# Altium schematic symbol library jlcpcb_2025_04_capacitors_extended_0402.schlib: 3594 symbols (part 17 of 20) (continued)
## GRT1555C1H221JA02D
designator C?  Capacitance: 220pF  (hidden comment: *)
Capacitor, Ceramic (MLCC), 220pF, ±5%, 50V, ±5%, SMD 0402; Manufacturer: Murata Electronics; Manufacturer Part Number: GRT1555C1H221JA02D; Package Size: 0402; JLCPCB Basic Part: No; JLCPCB Part Number: C782160; Supplier 1: LCSC; Category: Capacitors - MLCC; Supplier Part Number 1: C782160; Tolerance: ±5%; Voltage Rating: 50V; RoHS: Yes; ComponentLink1Description: Datasheet; ComponentLink1URL: https://wmsc.lcsc.com/wmsc/upload/file/pdf/v2/lcsc/2009161209_Murata-Electronics-GRT1555C1H221JA02D_C782160.pdf; ComponentLink2Description: JLCPCB Part URL; ComponentLink2URL: https://jlcpcb.com/partdetail/C782160; ComponentLink3Description: LCSC Part URL; ComponentLink3URL: https://lcsc.com/product-detail/Multilayer-Ceramic-Capacitors-MLCC---SMD-SMT_Murata-Electronics-Murata-Electronics-GRT1555C1H221JA02D_C782160.html
footprint CAP-0402 (0402 (1005M) Capacitor)
pins: 1, 2

## GRT1555C1H270JA02D
designator C?  Capacitance: 27pF  (hidden comment: *)
Capacitor, Ceramic (MLCC), 27pF, ±5%, null, ±5%, SMD 0402; Manufacturer: Murata Electronics; Manufacturer Part Number: GRT1555C1H270JA02D; Package Size: 0402; JLCPCB Basic Part: No; JLCPCB Part Number: C782161; Supplier 1: LCSC; Category: Capacitors - MLCC; Supplier Part Number 1: C782161; Tolerance: ±5%; Voltage Rating: null; RoHS: Yes; ComponentLink1Description: Datasheet; ComponentLink1URL: https://wmsc.lcsc.com/wmsc/upload/file/pdf/v2/lcsc/2009161209_Murata-Electronics-GRT1555C1H270JA02D_C782161.pdf; ComponentLink2Description: JLCPCB Part URL; ComponentLink2URL: https://jlcpcb.com/partdetail/C782161; ComponentLink3Description: LCSC Part URL; ComponentLink3URL: https://lcsc.com/product-detail/Multilayer-Ceramic-Capacitors-MLCC---SMD-SMT_Murata-Electronics-Murata-Electronics-GRT1555C1H270JA02D_C782161.html
footprint CAP-0402 (0402 (1005M) Capacitor)
pins: 1, 2

## GRT1555C1H330FA02D
designator C?  Capacitance: 33pF  (hidden comment: *)
Capacitor, Ceramic (MLCC), 33pF, ±1%, 50V, C0G, ±1%, SMD 0402; Manufacturer: Murata Electronics; Manufacturer Part Number: GRT1555C1H330FA02D; Package Size: 0402; JLCPCB Basic Part: No; JLCPCB Part Number: C3010442; Supplier 1: LCSC; Category: Capacitors - MLCC; Supplier Part Number 1: C3010442; Tolerance: ±1%; Voltage Rating: 50V; Temperature Coefficient: C0G; RoHS: Yes; ComponentLink1Description: Datasheet; ComponentLink1URL: https://wmsc.lcsc.com/wmsc/upload/file/pdf/v2/lcsc/2205061630_Murata-Electronics-GRT1555C1H330FA02D_C3010442.pdf; ComponentLink2Description: JLCPCB Part URL; ComponentLink2URL: https://jlcpcb.com/partdetail/C3010442; ComponentLink3Description: LCSC Part URL; ComponentLink3URL: https://lcsc.com/product-detail/Multilayer-Ceramic-Capacitors-MLCC---SMD-SMT_Murata-Electronics-Murata-Electronics-GRT1555C1H330FA02D_C3010442.html
footprint CAP-0402 (0402 (1005M) Capacitor)
pins: 1, 2

## GRT1555C1H330JA02D
designator C?  Capacitance: 33pF  (hidden comment: *)
Capacitor, Ceramic (MLCC), 33pF, ±5%, null, ±5%, SMD 0402; Manufacturer: Murata Electronics; Manufacturer Part Number: GRT1555C1H330JA02D; Package Size: 0402; JLCPCB Basic Part: No; JLCPCB Part Number: C711076; Supplier 1: LCSC; Category: Capacitors - MLCC; Supplier Part Number 1: C711076; Tolerance: ±5%; Voltage Rating: null; RoHS: Yes; ComponentLink1Description: Datasheet; ComponentLink1URL: https://wmsc.lcsc.com/wmsc/upload/file/pdf/v2/lcsc/2009181536_Murata-Electronics-GRT1555C1H330JA02D_C711076.pdf; ComponentLink2Description: JLCPCB Part URL; ComponentLink2URL: https://jlcpcb.com/partdetail/C711076; ComponentLink3Description: LCSC Part URL; ComponentLink3URL: https://lcsc.com/product-detail/Multilayer-Ceramic-Capacitors-MLCC---SMD-SMT_Murata-Electronics-Murata-Electronics-GRT1555C1H330JA02D_C711076.html
footprint CAP-0402 (0402 (1005M) Capacitor)
pins: 1, 2

## GRT1555C1H470JA02D
designator C?  Capacitance: 47pF  (hidden comment: *)
Capacitor, Ceramic (MLCC), 47pF, ±5%, null, ±5%, SMD 0402; Manufacturer: Murata Electronics; Manufacturer Part Number: GRT1555C1H470JA02D; Package Size: 0402; JLCPCB Basic Part: No; JLCPCB Part Number: C782162; Supplier 1: LCSC; Category: Capacitors - MLCC; Supplier Part Number 1: C782162; Tolerance: ±5%; Voltage Rating: null; RoHS: Yes; ComponentLink1Description: Datasheet; ComponentLink1URL: https://wmsc.lcsc.com/wmsc/upload/file/pdf/v2/lcsc/2009161209_Murata-Electronics-GRT1555C1H470JA02D_C782162.pdf; ComponentLink2Description: JLCPCB Part URL; ComponentLink2URL: https://jlcpcb.com/partdetail/C782162; ComponentLink3Description: LCSC Part URL; ComponentLink3URL: https://lcsc.com/product-detail/Multilayer-Ceramic-Capacitors-MLCC---SMD-SMT_Murata-Electronics-Murata-Electronics-GRT1555C1H470JA02D_C782162.html
footprint CAP-0402 (0402 (1005M) Capacitor)
pins: 1, 2

## GRT1555C1H471FA02D
designator C?  Capacitance: 470pF  (hidden comment: *)
Capacitor, Ceramic (MLCC), 470pF, ±1%, 50V, C0G, ±1%, SMD 0402; Manufacturer: Murata Electronics; Manufacturer Part Number: GRT1555C1H471FA02D; Package Size: 0402; JLCPCB Basic Part: No; JLCPCB Part Number: C3890653; Supplier 1: LCSC; Category: Capacitors - MLCC; Supplier Part Number 1: C3890653; Tolerance: ±1%; Voltage Rating: 50V; Temperature Coefficient: C0G; RoHS: Yes; ComponentLink1Description: Datasheet; ComponentLink1URL: https://wmsc.lcsc.com/wmsc/upload/file/pdf/v2/lcsc/2308111801_Murata-Electronics-GRT1555C1H471FA02D_C3890653.pdf; ComponentLink2Description: JLCPCB Part URL; ComponentLink2URL: https://jlcpcb.com/partdetail/C3890653; ComponentLink3Description: LCSC Part URL; ComponentLink3URL: https://lcsc.com/product-detail/Multilayer-Ceramic-Capacitors-MLCC---SMD-SMT_Murata-Electronics-Murata-Electronics-GRT1555C1H471FA02D_C3890653.html
footprint CAP-0402 (0402 (1005M) Capacitor)
pins: 1, 2

## GRT1555C1H471JA02D
designator C?  Capacitance: 470pF  (hidden comment: *)
Capacitor, Ceramic (MLCC), 470pF, ±5%, null, ±5%, SMD 0402; Manufacturer: Murata Electronics; Manufacturer Part Number: GRT1555C1H471JA02D; Package Size: 0402; JLCPCB Basic Part: No; JLCPCB Part Number: C782163; Supplier 1: LCSC; Category: Capacitors - MLCC; Supplier Part Number 1: C782163; Tolerance: ±5%; Voltage Rating: null; RoHS: Yes; ComponentLink1Description: Datasheet; ComponentLink1URL: https://wmsc.lcsc.com/wmsc/upload/file/pdf/v2/lcsc/2009161209_Murata-Electronics-GRT1555C1H471JA02D_C782163.pdf; ComponentLink2Description: JLCPCB Part URL; ComponentLink2URL: https://jlcpcb.com/partdetail/C782163; ComponentLink3Description: LCSC Part URL; ComponentLink3URL: https://lcsc.com/product-detail/Multilayer-Ceramic-Capacitors-MLCC---SMD-SMT_Murata-Electronics-Murata-Electronics-GRT1555C1H471JA02D_C782163.html
footprint CAP-0402 (0402 (1005M) Capacitor)
pins: 1, 2

## GRT1555C2A100JA02D
designator C?  Capacitance: 10pF  (hidden comment: *)
Capacitor, Ceramic (MLCC), 10pF, ±5%, 100V, ±5%, SMD 0402; Manufacturer: Murata Electronics; Manufacturer Part Number: GRT1555C2A100JA02D; Package Size: 0402; JLCPCB Basic Part: No; JLCPCB Part Number: C5457062; Supplier 1: LCSC; Category: Capacitors - MLCC; Supplier Part Number 1: C5457062; Tolerance: ±5%; Voltage Rating: 100V; RoHS: Yes; ComponentLink1Description: Datasheet; ComponentLink1URL: https://wmsc.lcsc.com/wmsc/upload/file/pdf/v2/lcsc/2305231206_Murata-Electronics-GRT1555C2A100JA02D_C5457062.pdf; ComponentLink2Description: JLCPCB Part URL; ComponentLink2URL: https://jlcpcb.com/partdetail/C5457062; ComponentLink3Description: LCSC Part URL; ComponentLink3URL: https://lcsc.com/product-detail/Multilayer-Ceramic-Capacitors-MLCC---SMD-SMT_Murata-Electronics-Murata-Electronics-GRT1555C2A100JA02D_C5457062.html
footprint CAP-0402 (0402 (1005M) Capacitor)
pins: 1, 2

## GRT1555C2A101JA02D
designator C?  Capacitance: 100pF  (hidden comment: *)
Capacitor, Ceramic (MLCC), 100pF, ±5%, 100V, ±5%, SMD 0402; Manufacturer: Murata Electronics; Manufacturer Part Number: GRT1555C2A101JA02D; Package Size: 0402; JLCPCB Basic Part: No; JLCPCB Part Number: C907728; Supplier 1: LCSC; Category: Capacitors - MLCC; Supplier Part Number 1: C907728; Tolerance: ±5%; Voltage Rating: 100V; RoHS: Yes; ComponentLink1Description: Datasheet; ComponentLink1URL: https://wmsc.lcsc.com/wmsc/upload/file/pdf/v2/lcsc/2304140030_Murata-Electronics-GRT1555C2A101JA02D_C907728.pdf; ComponentLink2Description: JLCPCB Part URL; ComponentLink2URL: https://jlcpcb.com/partdetail/C907728; ComponentLink3Description: LCSC Part URL; ComponentLink3URL: https://lcsc.com/product-detail/Multilayer-Ceramic-Capacitors-MLCC---SMD-SMT_Murata-Electronics-Murata-Electronics-GRT1555C2A101JA02D_C907728.html
footprint CAP-0402 (0402 (1005M) Capacitor)
pins: 1, 2

## HGC0402G01R0C500NTEJ
designator C?  Capacitance: 1pF  (hidden comment: *)
Capacitor, Ceramic (MLCC), 1pF, 50V, C0G, SMD 0402; Manufacturer: Chinocera; Manufacturer Part Number: HGC0402G01R0C500NTEJ; Package Size: 0402; JLCPCB Basic Part: No; JLCPCB Part Number: C482480; Supplier 1: LCSC; Category: Capacitors - MLCC; Supplier Part Number 1: C482480; Voltage Rating: 50V; Temperature Coefficient: C0G; RoHS: Yes; ComponentLink1Description: Datasheet; ComponentLink1URL: https://wmsc.lcsc.com/wmsc/upload/file/pdf/v2/lcsc/2403201120_Chinocera-HGC0402G01R0C500NTEJ_C482480.pdf; ComponentLink2Description: JLCPCB Part URL; ComponentLink2URL: https://jlcpcb.com/partdetail/C482480; ComponentLink3Description: LCSC Part URL; ComponentLink3URL: https://lcsc.com/product-detail/Multilayer-Ceramic-Capacitors-MLCC---SMD-SMT_Chinocera-Chinocera-HGC0402G01R0C500NTEJ_C482480.html
footprint CAP-0402 (0402 (1005M) Capacitor)
pins: 1, 2

## HGC0402G02R5B500NTEJ
designator C?  Capacitance: 2.5pF  (hidden comment: *)
Capacitor, Ceramic (MLCC), 2.5pF, 50V, C0G, SMD 0402; Manufacturer: Chinocera; Manufacturer Part Number: HGC0402G02R5B500NTEJ; Package Size: 0402; JLCPCB Basic Part: No; JLCPCB Part Number: C5186875; Supplier 1: LCSC; Category: Capacitors - MLCC; Supplier Part Number 1: C5186875; Voltage Rating: 50V; Temperature Coefficient: C0G; RoHS: Yes; ComponentLink1Description: Datasheet; ComponentLink1URL: https://wmsc.lcsc.com/wmsc/upload/file/pdf/v2/lcsc/2403201121_Chinocera-HGC0402G02R5B500NTEJ_C5186875.pdf; ComponentLink2Description: JLCPCB Part URL; ComponentLink2URL: https://jlcpcb.com/partdetail/C5186875; ComponentLink3Description: LCSC Part URL; ComponentLink3URL: https://lcsc.com/product-detail/Multilayer-Ceramic-Capacitors-MLCC---SMD-SMT_Chinocera-Chinocera-HGC0402G02R5B500NTEJ_C5186875.html
footprint CAP-0402 (0402 (1005M) Capacitor)
pins: 1, 2

## HGC0402G03R6C500NTEJ
designator C?  Capacitance: 3.6pF  (hidden comment: *)
Capacitor, Ceramic (MLCC), 3.6pF, 50V, C0G, SMD 0402; Manufacturer: Chinocera; Manufacturer Part Number: HGC0402G03R6C500NTEJ; Package Size: 0402; JLCPCB Basic Part: No; JLCPCB Part Number: C5186879; Supplier 1: LCSC; Category: Capacitors - MLCC; Supplier Part Number 1: C5186879; Voltage Rating: 50V; Temperature Coefficient: C0G; RoHS: Yes; ComponentLink1Description: Datasheet; ComponentLink1URL: https://wmsc.lcsc.com/wmsc/upload/file/pdf/v2/lcsc/2403201121_Chinocera-HGC0402G03R6C500NTEJ_C5186879.pdf; ComponentLink2Description: JLCPCB Part URL; ComponentLink2URL: https://jlcpcb.com/partdetail/C5186879; ComponentLink3Description: LCSC Part URL; ComponentLink3URL: https://lcsc.com/product-detail/Multilayer-Ceramic-Capacitors-MLCC---SMD-SMT_Chinocera-Chinocera-HGC0402G03R6C500NTEJ_C5186879.html
footprint CAP-0402 (0402 (1005M) Capacitor)
pins: 1, 2

## HGC0402G04R7C500NTEJ
designator C?  Capacitance: 4.7pF  (hidden comment: *)
Capacitor, Ceramic (MLCC), 4.7pF, 50V, C0G, SMD 0402; Manufacturer: Chinocera; Manufacturer Part Number: HGC0402G04R7C500NTEJ; Package Size: 0402; JLCPCB Basic Part: No; JLCPCB Part Number: C482481; Supplier 1: LCSC; Category: Capacitors - MLCC; Supplier Part Number 1: C482481; Voltage Rating: 50V; Temperature Coefficient: C0G; RoHS: Yes; ComponentLink1Description: Datasheet; ComponentLink1URL: https://wmsc.lcsc.com/wmsc/upload/file/pdf/v2/lcsc/2403201120_Chinocera-HGC0402G04R7C500NTEJ_C482481.pdf; ComponentLink2Description: JLCPCB Part URL; ComponentLink2URL: https://jlcpcb.com/partdetail/C482481; ComponentLink3Description: LCSC Part URL; ComponentLink3URL: https://lcsc.com/product-detail/Multilayer-Ceramic-Capacitors-MLCC---SMD-SMT_Chinocera-Chinocera-HGC0402G04R7C500NTEJ_C482481.html
footprint CAP-0402 (0402 (1005M) Capacitor)
pins: 1, 2

## HGC0402G06R2C500NTEJ
designator C?  Capacitance: 6.2pF  (hidden comment: *)
Capacitor, Ceramic (MLCC), 6.2pF, 50V, C0G, SMD 0402; Manufacturer: Chinocera; Manufacturer Part Number: HGC0402G06R2C500NTEJ; Package Size: 0402; JLCPCB Basic Part: No; JLCPCB Part Number: C5186885; Supplier 1: LCSC; Category: Capacitors - MLCC; Supplier Part Number 1: C5186885; Voltage Rating: 50V; Temperature Coefficient: C0G; RoHS: Yes; ComponentLink1Description: Datasheet; ComponentLink1URL: https://wmsc.lcsc.com/wmsc/upload/file/pdf/v2/lcsc/2403201121_Chinocera-HGC0402G06R2C500NTEJ_C5186885.pdf; ComponentLink2Description: JLCPCB Part URL; ComponentLink2URL: https://jlcpcb.com/partdetail/C5186885; ComponentLink3Description: LCSC Part URL; ComponentLink3URL: https://lcsc.com/product-detail/Multilayer-Ceramic-Capacitors-MLCC---SMD-SMT_Chinocera-Chinocera-HGC0402G06R2C500NTEJ_C5186885.html
footprint CAP-0402 (0402 (1005M) Capacitor)
pins: 1, 2

## HGC0402G0100J500NTEJ
designator C?  Capacitance: 10pF  (hidden comment: *)
Capacitor, Ceramic (MLCC), 10pF, ±5%, 50V, C0G, ±5%, SMD 0402; Manufacturer: Chinocera; Manufacturer Part Number: HGC0402G0100J500NTEJ; Package Size: 0402; JLCPCB Basic Part: No; JLCPCB Part Number: C482482; Supplier 1: LCSC; Category: Capacitors - MLCC; Supplier Part Number 1: C482482; Tolerance: ±5%; Voltage Rating: 50V; Temperature Coefficient: C0G; RoHS: Yes; ComponentLink1Description: Datasheet; ComponentLink1URL: https://wmsc.lcsc.com/wmsc/upload/file/pdf/v2/lcsc/2403201120_Chinocera-HGC0402G0100J500NTEJ_C482482.pdf; ComponentLink2Description: JLCPCB Part URL; ComponentLink2URL: https://jlcpcb.com/partdetail/C482482; ComponentLink3Description: LCSC Part URL; ComponentLink3URL: https://lcsc.com/product-detail/Multilayer-Ceramic-Capacitors-MLCC---SMD-SMT_Chinocera-Chinocera-HGC0402G0100J500NTEJ_C482482.html
footprint CAP-0402 (0402 (1005M) Capacitor)
pins: 1, 2

## HGC0402G0101J500NTEJ
designator C?  Capacitance: 100pF  (hidden comment: *)
Capacitor, Ceramic (MLCC), 100pF, ±5%, 50V, C0G, ±5%, SMD 0402; Manufacturer: Chinocera; Manufacturer Part Number: HGC0402G0101J500NTEJ; Package Size: 0402; JLCPCB Basic Part: No; JLCPCB Part Number: C482486; Supplier 1: LCSC; Category: Capacitors - MLCC; Supplier Part Number 1: C482486; Tolerance: ±5%; Voltage Rating: 50V; Temperature Coefficient: C0G; RoHS: Yes; ComponentLink1Description: Datasheet; ComponentLink1URL: https://wmsc.lcsc.com/wmsc/upload/file/pdf/v2/lcsc/2403201120_Chinocera-HGC0402G0101J500NTEJ_C482486.pdf; ComponentLink2Description: JLCPCB Part URL; ComponentLink2URL: https://jlcpcb.com/partdetail/C482486; ComponentLink3Description: LCSC Part URL; ComponentLink3URL: https://lcsc.com/product-detail/Multilayer-Ceramic-Capacitors-MLCC---SMD-SMT_Chinocera-Chinocera-HGC0402G0101J500NTEJ_C482486.html
footprint CAP-0402 (0402 (1005M) Capacitor)
pins: 1, 2

## HGC0402G0120J500NTEJ
designator C?  Capacitance: 12pF  (hidden comment: *)
Capacitor, Ceramic (MLCC), 12pF, ±5%, 50V, C0G, ±5%, SMD 0402; Manufacturer: Chinocera; Manufacturer Part Number: HGC0402G0120J500NTEJ; Package Size: 0402; JLCPCB Basic Part: No; JLCPCB Part Number: C482487; Supplier 1: LCSC; Category: Capacitors - MLCC; Supplier Part Number 1: C482487; Tolerance: ±5%; Voltage Rating: 50V; Temperature Coefficient: C0G; RoHS: Yes; ComponentLink1Description: Datasheet; ComponentLink1URL: https://wmsc.lcsc.com/wmsc/upload/file/pdf/v2/lcsc/2403201120_Chinocera-HGC0402G0120J500NTEJ_C482487.pdf; ComponentLink2Description: JLCPCB Part URL; ComponentLink2URL: https://jlcpcb.com/partdetail/C482487; ComponentLink3Description: LCSC Part URL; ComponentLink3URL: https://lcsc.com/product-detail/Multilayer-Ceramic-Capacitors-MLCC---SMD-SMT_Chinocera-Chinocera-HGC0402G0120J500NTEJ_C482487.html
footprint CAP-0402 (0402 (1005M) Capacitor)
pins: 1, 2

## HGC0402G0330J500NTEJ
designator C?  Capacitance: 33pF  (hidden comment: *)
Capacitor, Ceramic (MLCC), 33pF, ±5%, 50V, C0G, ±5%, SMD 0402; Manufacturer: Chinocera; Manufacturer Part Number: HGC0402G0330J500NTEJ; Package Size: 0402; JLCPCB Basic Part: No; JLCPCB Part Number: C482484; Supplier 1: LCSC; Category: Capacitors - MLCC; Supplier Part Number 1: C482484; Tolerance: ±5%; Voltage Rating: 50V; Temperature Coefficient: C0G; RoHS: Yes; ComponentLink1Description: Datasheet; ComponentLink1URL: https://wmsc.lcsc.com/wmsc/upload/file/pdf/v2/lcsc/2403201120_Chinocera-HGC0402G0330J500NTEJ_C482484.pdf; ComponentLink2Description: JLCPCB Part URL; ComponentLink2URL: https://jlcpcb.com/partdetail/C482484; ComponentLink3Description: LCSC Part URL; ComponentLink3URL: https://lcsc.com/product-detail/Multilayer-Ceramic-Capacitors-MLCC---SMD-SMT_Chinocera-Chinocera-HGC0402G0330J500NTEJ_C482484.html
footprint CAP-0402 (0402 (1005M) Capacitor)
pins: 1, 2

## HGC0402G0470J500NTEJ
designator C?  Capacitance: 47pF  (hidden comment: *)
Capacitor, Ceramic (MLCC), 47pF, ±5%, 50V, C0G, ±5%, SMD 0402; Manufacturer: Chinocera; Manufacturer Part Number: HGC0402G0470J500NTEJ; Package Size: 0402; JLCPCB Basic Part: No; JLCPCB Part Number: C482485; Supplier 1: LCSC; Category: Capacitors - MLCC; Supplier Part Number 1: C482485; Tolerance: ±5%; Voltage Rating: 50V; Temperature Coefficient: C0G; RoHS: Yes; ComponentLink1Description: Datasheet; ComponentLink1URL: https://wmsc.lcsc.com/wmsc/upload/file/pdf/v2/lcsc/2403201120_Chinocera-HGC0402G0470J500NTEJ_C482485.pdf; ComponentLink2Description: JLCPCB Part URL; ComponentLink2URL: https://jlcpcb.com/partdetail/C482485; ComponentLink3Description: LCSC Part URL; ComponentLink3URL: https://lcsc.com/product-detail/Multilayer-Ceramic-Capacitors-MLCC---SMD-SMT_Chinocera-Chinocera-HGC0402G0470J500NTEJ_C482485.html
footprint CAP-0402 (0402 (1005M) Capacitor)
pins: 1, 2

## HGC0402R5105K250NTEJ
designator C?  Capacitance: 1uF  (hidden comment: *)
Capacitor, Ceramic (MLCC), 1uF, ±10%, 25V, X5R, ±10%, SMD 0402; Manufacturer: Chinocera; Manufacturer Part Number: HGC0402R5105K250NTEJ; Package Size: 0402; JLCPCB Basic Part: No; JLCPCB Part Number: C7472946; Supplier 1: LCSC; Category: Capacitors - MLCC; Supplier Part Number 1: C7472946; Tolerance: ±10%; Voltage Rating: 25V; Temperature Coefficient: X5R; RoHS: Yes; ComponentLink1Description: Datasheet; ComponentLink1URL: https://wmsc.lcsc.com/wmsc/upload/file/pdf/v2/lcsc/2403201122_Chinocera-HGC0402R5105K250NTEJ_C7472946.pdf; ComponentLink2Description: JLCPCB Part URL; ComponentLink2URL: https://jlcpcb.com/partdetail/C7472946; ComponentLink3Description: LCSC Part URL; ComponentLink3URL: https://lcsc.com/product-detail/Multilayer-Ceramic-Capacitors-MLCC---SMD-SMT_Chinocera-Chinocera-HGC0402R5105K250NTEJ_C7472946.html
footprint CAP-0402 (0402 (1005M) Capacitor)
pins: 1, 2

## HGC0402R5105K500NTEJ
designator C?  Capacitance: 1uF  (hidden comment: *)
Capacitor, Ceramic (MLCC), 1uF, ±10%, 50V, X5R, ±10%, SMD 0402; Manufacturer: Chinocera; Manufacturer Part Number: HGC0402R5105K500NTEJ; Package Size: 0402; JLCPCB Basic Part: No; JLCPCB Part Number: C7472948; Supplier 1: LCSC; Category: Capacitors - MLCC; Supplier Part Number 1: C7472948; Tolerance: ±10%; Voltage Rating: 50V; Temperature Coefficient: X5R; RoHS: Yes; ComponentLink1Description: Datasheet; ComponentLink1URL: https://wmsc.lcsc.com/wmsc/upload/file/pdf/v2/lcsc/2403201122_Chinocera-HGC0402R5105K500NTEJ_C7472948.pdf; ComponentLink2Description: JLCPCB Part URL; ComponentLink2URL: https://jlcpcb.com/partdetail/C7472948; ComponentLink3Description: LCSC Part URL; ComponentLink3URL: https://lcsc.com/product-detail/Multilayer-Ceramic-Capacitors-MLCC---SMD-SMT_Chinocera-Chinocera-HGC0402R5105K500NTEJ_C7472948.html
footprint CAP-0402 (0402 (1005M) Capacitor)
pins: 1, 2

## HGC0402R5106M100NTEJ
designator C?  Capacitance: 10uF  (hidden comment: *)
Capacitor, Ceramic (MLCC), 10uF, ±20%, 10V, X5R, ±20%, SMD 0402; Manufacturer: Chinocera; Manufacturer Part Number: HGC0402R5106M100NTEJ; Package Size: 0402; JLCPCB Basic Part: No; JLCPCB Part Number: C7472949; Supplier 1: LCSC; Category: Capacitors - MLCC; Supplier Part Number 1: C7472949; Tolerance: ±20%; Voltage Rating: 10V; Temperature Coefficient: X5R; RoHS: Yes; ComponentLink1Description: Datasheet; ComponentLink1URL: https://wmsc.lcsc.com/wmsc/upload/file/pdf/v2/lcsc/2403201122_Chinocera-HGC0402R5106M100NTEJ_C7472949.pdf; ComponentLink2Description: JLCPCB Part URL; ComponentLink2URL: https://jlcpcb.com/partdetail/C7472949; ComponentLink3Description: LCSC Part URL; ComponentLink3URL: https://lcsc.com/product-detail/Multilayer-Ceramic-Capacitors-MLCC---SMD-SMT_Chinocera-Chinocera-HGC0402R5106M100NTEJ_C7472949.html
footprint CAP-0402 (0402 (1005M) Capacitor)
pins: 1, 2

## HGC0402R5225K160NTEJ
designator C?  Capacitance: 2.2uF  (hidden comment: *)
Capacitor, Ceramic (MLCC), 2.2uF, ±10%, 16V, X5R, ±10%, SMD 0402; Manufacturer: Chinocera; Manufacturer Part Number: HGC0402R5225K160NTEJ; Package Size: 0402; JLCPCB Basic Part: No; JLCPCB Part Number: C7432763; Supplier 1: LCSC; Category: Capacitors - MLCC; Supplier Part Number 1: C7432763; Tolerance: ±10%; Voltage Rating: 16V; Temperature Coefficient: X5R; RoHS: Yes; ComponentLink1Description: Datasheet; ComponentLink1URL: https://wmsc.lcsc.com/wmsc/upload/file/pdf/v2/lcsc/2403201121_Chinocera-HGC0402R5225K160NTEJ_C7432763.pdf; ComponentLink2Description: JLCPCB Part URL; ComponentLink2URL: https://jlcpcb.com/partdetail/C7432763; ComponentLink3Description: LCSC Part URL; ComponentLink3URL: https://lcsc.com/product-detail/Multilayer-Ceramic-Capacitors-MLCC---SMD-SMT_Chinocera-Chinocera-HGC0402R5225K160NTEJ_C7432763.html
footprint CAP-0402 (0402 (1005M) Capacitor)
pins: 1, 2

## HGC0402R5226M6R3NTEJ
designator C?  Capacitance: 22uF  (hidden comment: *)
Capacitor, Ceramic (MLCC), 22uF, ±20%, 6.3V, X5R, ±20%, SMD 0402; Manufacturer: Chinocera; Manufacturer Part Number: HGC0402R5226M6R3NTEJ; Package Size: 0402; JLCPCB Basic Part: No; JLCPCB Part Number: C7432764; Supplier 1: LCSC; Category: Capacitors - MLCC; Supplier Part Number 1: C7432764; Tolerance: ±20%; Voltage Rating: 6.3V; Temperature Coefficient: X5R; RoHS: Yes; ComponentLink1Description: Datasheet; ComponentLink1URL: https://wmsc.lcsc.com/wmsc/upload/file/pdf/v2/lcsc/2403201121_Chinocera-HGC0402R5226M6R3NTEJ_C7432764.pdf; ComponentLink2Description: JLCPCB Part URL; ComponentLink2URL: https://jlcpcb.com/partdetail/C7432764; ComponentLink3Description: LCSC Part URL; ComponentLink3URL: https://lcsc.com/product-detail/Multilayer-Ceramic-Capacitors-MLCC---SMD-SMT_Chinocera-Chinocera-HGC0402R5226M6R3NTEJ_C7432764.html
footprint CAP-0402 (0402 (1005M) Capacitor)
pins: 1, 2

## HGC0402R5475K100NTEJ
designator C?  Capacitance: 4.7uF  (hidden comment: *)
Capacitor, Ceramic (MLCC), 4.7uF, ±10%, 10V, X5R, ±10%, SMD 0402; Manufacturer: Chinocera; Manufacturer Part Number: HGC0402R5475K100NTEJ; Package Size: 0402; JLCPCB Basic Part: No; JLCPCB Part Number: C7472956; Supplier 1: LCSC; Category: Capacitors - MLCC; Supplier Part Number 1: C7472956; Tolerance: ±10%; Voltage Rating: 10V; Temperature Coefficient: X5R; RoHS: Yes; ComponentLink1Description: Datasheet; ComponentLink1URL: https://wmsc.lcsc.com/wmsc/upload/file/pdf/v2/lcsc/2403201122_Chinocera-HGC0402R5475K100NTEJ_C7472956.pdf; ComponentLink2Description: JLCPCB Part URL; ComponentLink2URL: https://jlcpcb.com/partdetail/C7472956; ComponentLink3Description: LCSC Part URL; ComponentLink3URL: https://lcsc.com/product-detail/Multilayer-Ceramic-Capacitors-MLCC---SMD-SMT_Chinocera-Chinocera-HGC0402R5475K100NTEJ_C7472956.html
footprint CAP-0402 (0402 (1005M) Capacitor)
pins: 1, 2

## HGC0402R7102K500NTEJ
designator C?  Capacitance: 1nF  (hidden comment: *)
Capacitor, Ceramic (MLCC), 1nF, ±10%, 50V, X7R, ±10%, SMD 0402; Manufacturer: Chinocera; Manufacturer Part Number: HGC0402R7102K500NTEJ; Package Size: 0402; JLCPCB Basic Part: No; JLCPCB Part Number: C482488; Supplier 1: LCSC; Category: Capacitors - MLCC; Supplier Part Number 1: C482488; Tolerance: ±10%; Voltage Rating: 50V; Temperature Coefficient: X7R; RoHS: Yes; ComponentLink1Description: Datasheet; ComponentLink1URL: https://wmsc.lcsc.com/wmsc/upload/file/pdf/v2/lcsc/2403201120_Chinocera-HGC0402R7102K500NTEJ_C482488.pdf; ComponentLink2Description: JLCPCB Part URL; ComponentLink2URL: https://jlcpcb.com/partdetail/C482488; ComponentLink3Description: LCSC Part URL; ComponentLink3URL: https://lcsc.com/product-detail/Multilayer-Ceramic-Capacitors-MLCC---SMD-SMT_Chinocera-Chinocera-HGC0402R7102K500NTEJ_C482488.html
footprint CAP-0402 (0402 (1005M) Capacitor)
pins: 1, 2

## HGC0402R7103K500NTEJ
designator C?  Capacitance: 10nF  (hidden comment: *)
Capacitor, Ceramic (MLCC), 10nF, ±10%, 50V, X7R, ±10%, SMD 0402; Manufacturer: Chinocera; Manufacturer Part Number: HGC0402R7103K500NTEJ; Package Size: 0402; JLCPCB Basic Part: No; JLCPCB Part Number: C482489; Supplier 1: LCSC; Category: Capacitors - MLCC; Supplier Part Number 1: C482489; Tolerance: ±10%; Voltage Rating: 50V; Temperature Coefficient: X7R; RoHS: Yes; ComponentLink1Description: Datasheet; ComponentLink1URL: https://wmsc.lcsc.com/wmsc/upload/file/pdf/v2/lcsc/2403201120_Chinocera-HGC0402R7103K500NTEJ_C482489.pdf; ComponentLink2Description: JLCPCB Part URL; ComponentLink2URL: https://jlcpcb.com/partdetail/C482489; ComponentLink3Description: LCSC Part URL; ComponentLink3URL: https://lcsc.com/product-detail/Multilayer-Ceramic-Capacitors-MLCC---SMD-SMT_Chinocera-Chinocera-HGC0402R7103K500NTEJ_C482489.html
footprint CAP-0402 (0402 (1005M) Capacitor)
pins: 1, 2

## HGC0402R7182K500NTEJ
designator C?  Capacitance: 1.8nF  (hidden comment: *)
Capacitor, Ceramic (MLCC), 1.8nF, 50V, X7R, SMD 0402; Manufacturer: Chinocera; Manufacturer Part Number: HGC0402R7182K500NTEJ; Package Size: 0402; JLCPCB Basic Part: No; JLCPCB Part Number: C5186897; Supplier 1: LCSC; Category: Capacitors - MLCC; Supplier Part Number 1: C5186897; Voltage Rating: 50V; Temperature Coefficient: X7R; RoHS: Yes; ComponentLink1Description: Datasheet; ComponentLink1URL: https://wmsc.lcsc.com/wmsc/upload/file/pdf/v2/lcsc/2403201121_Chinocera-HGC0402R7182K500NTEJ_C5186897.pdf; ComponentLink2Description: JLCPCB Part URL; ComponentLink2URL: https://jlcpcb.com/partdetail/C5186897; ComponentLink3Description: LCSC Part URL; ComponentLink3URL: https://lcsc.com/product-detail/Multilayer-Ceramic-Capacitors-MLCC---SMD-SMT_Chinocera-Chinocera-HGC0402R7182K500NTEJ_C5186897.html
footprint CAP-0402 (0402 (1005M) Capacitor)
pins: 1, 2

## HH15N1R0B500CT
designator C?  Capacitance: 1pF  (hidden comment: *)
Capacitor, Ceramic (MLCC), 1pF, 50V, NP0, SMD 0402; Manufacturer: Walsin Tech Corp; Manufacturer Part Number: HH15N1R0B500CT; Package Size: 0402; JLCPCB Basic Part: No; JLCPCB Part Number: C340643; Supplier 1: LCSC; Category: Capacitors - MLCC; Supplier Part Number 1: C340643; Voltage Rating: 50V; Temperature Coefficient: NP0; RoHS: Yes; ComponentLink1Description: Datasheet; ComponentLink1URL: https://wmsc.lcsc.com/wmsc/upload/file/pdf/v2/lcsc/2304140030_Walsin-Tech-Corp-HH15N1R0B500CT_C340643.pdf; ComponentLink2Description: JLCPCB Part URL; ComponentLink2URL: https://jlcpcb.com/partdetail/C340643; ComponentLink3Description: LCSC Part URL; ComponentLink3URL: https://lcsc.com/product-detail/Multilayer-Ceramic-Capacitors-MLCC---SMD-SMT_Walsin-Tech-Corp-Walsin-Tech-Corp-HH15N1R0B500CT_C340643.html
footprint CAP-0402 (0402 (1005M) Capacitor)
pins: 1, 2

## HH15N1R5B500CT
designator C?  Capacitance: 1.5pF  (hidden comment: *)
Capacitor, Ceramic (MLCC), 1.5pF, 50V, NP0, SMD 0402; Manufacturer: Walsin Tech Corp; Manufacturer Part Number: HH15N1R5B500CT; Package Size: 0402; JLCPCB Basic Part: No; JLCPCB Part Number: C880756; Supplier 1: LCSC; Category: Capacitors - MLCC; Supplier Part Number 1: C880756; Voltage Rating: 50V; Temperature Coefficient: NP0; RoHS: Yes; ComponentLink1Description: Datasheet; ComponentLink1URL: https://wmsc.lcsc.com/wmsc/upload/file/pdf/v2/lcsc/2304140030_Walsin-Tech-Corp-HH15N1R5B500CT_C880756.pdf; ComponentLink2Description: JLCPCB Part URL; ComponentLink2URL: https://jlcpcb.com/partdetail/C880756; ComponentLink3Description: LCSC Part URL; ComponentLink3URL: https://lcsc.com/product-detail/Multilayer-Ceramic-Capacitors-MLCC---SMD-SMT_Walsin-Tech-Corp-Walsin-Tech-Corp-HH15N1R5B500CT_C880756.html
footprint CAP-0402 (0402 (1005M) Capacitor)
pins: 1, 2

## HH15N4R7B500CT
designator C?  Capacitance: 4.7pF  (hidden comment: *)
Capacitor, Ceramic (MLCC), 4.7pF, 50V, NP0, SMD 0402; Manufacturer: Walsin Tech Corp; Manufacturer Part Number: HH15N4R7B500CT; Package Size: 0402; JLCPCB Basic Part: No; JLCPCB Part Number: C304337; Supplier 1: LCSC; Category: Capacitors - MLCC; Supplier Part Number 1: C304337; Voltage Rating: 50V; Temperature Coefficient: NP0; RoHS: Yes; ComponentLink1Description: Datasheet; ComponentLink1URL: https://wmsc.lcsc.com/wmsc/upload/file/pdf/v2/lcsc/2304140030_Walsin-Tech-Corp-HH15N4R7B500CT_C304337.pdf; ComponentLink2Description: JLCPCB Part URL; ComponentLink2URL: https://jlcpcb.com/partdetail/C304337; ComponentLink3Description: LCSC Part URL; ComponentLink3URL: https://lcsc.com/product-detail/Multilayer-Ceramic-Capacitors-MLCC---SMD-SMT_Walsin-Tech-Corp-Walsin-Tech-Corp-HH15N4R7B500CT_C304337.html
footprint CAP-0402 (0402 (1005M) Capacitor)
pins: 1, 2

## HH15N150G500CT
designator C?  Capacitance: 15pF  (hidden comment: *)
Capacitor, Ceramic (MLCC), 15pF, ±2%, 50V, NP0, ±2%, SMD 0402; Manufacturer: Walsin Tech Corp; Manufacturer Part Number: HH15N150G500CT; Package Size: 0402; JLCPCB Basic Part: No; JLCPCB Part Number: C396822; Supplier 1: LCSC; Category: Capacitors - MLCC; Supplier Part Number 1: C396822; Tolerance: ±2%; Voltage Rating: 50V; Temperature Coefficient: NP0; RoHS: Yes; ComponentLink1Description: Datasheet; ComponentLink1URL: https://wmsc.lcsc.com/wmsc/upload/file/pdf/v2/lcsc/2304140030_Walsin-Tech-Corp-HH15N150G500CT_C396822.pdf; ComponentLink2Description: JLCPCB Part URL; ComponentLink2URL: https://jlcpcb.com/partdetail/C396822; ComponentLink3Description: LCSC Part URL; ComponentLink3URL: https://lcsc.com/product-detail/Multilayer-Ceramic-Capacitors-MLCC---SMD-SMT_Walsin-Tech-Corp-Walsin-Tech-Corp-HH15N150G500CT_C396822.html
footprint CAP-0402 (0402 (1005M) Capacitor)
pins: 1, 2

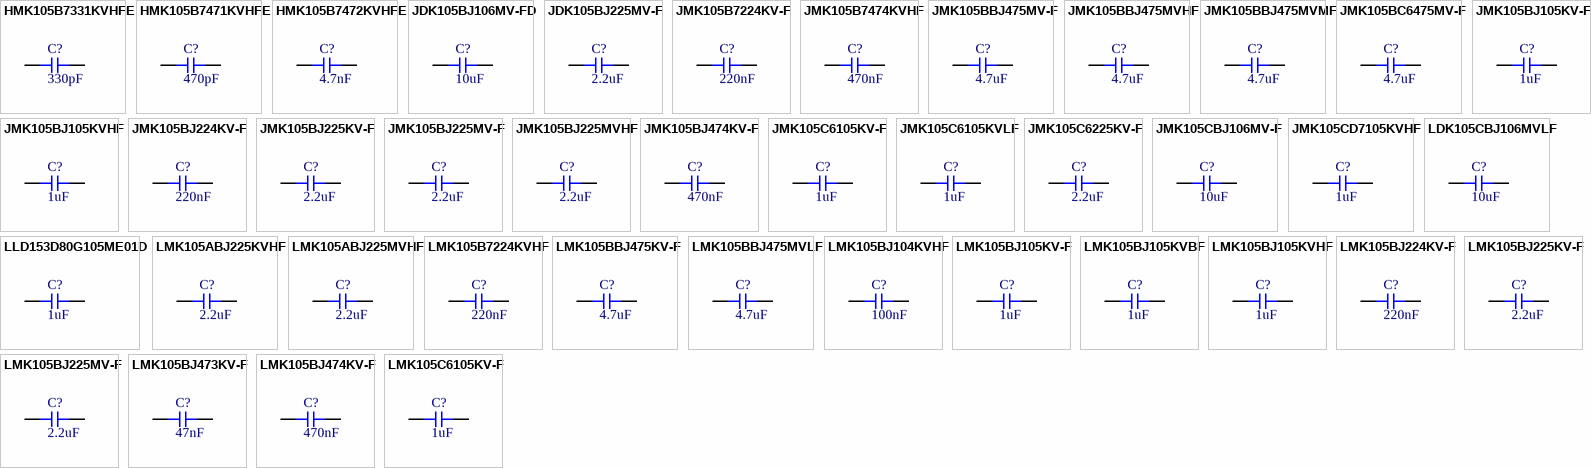
[diagram p77: symbols HMK105B7331KVHFE to LMK105C6105KV-F]

## HMK105B7331KVHFE
designator C?  Capacitance: 330pF  (hidden comment: *)
Capacitor, Ceramic (MLCC), 330pF, ±10%, 100V, X7R, ±10%, SMD 0402; Manufacturer: Taiyo Yuden; Manufacturer Part Number: HMK105B7331KVHFE; Package Size: 0402; JLCPCB Basic Part: No; JLCPCB Part Number: C1864511; Supplier 1: LCSC; Category: Capacitors - MLCC; Supplier Part Number 1: C1864511; Tolerance: ±10%; Voltage Rating: 100V; Temperature Coefficient: X7R; RoHS: Yes; ComponentLink1Description: Datasheet; ComponentLink1URL: https://wmsc.lcsc.com/wmsc/upload/file/pdf/v2/lcsc/2202251630_Taiyo-Yuden-HMK105B7331KVHFE_C1864511.pdf; ComponentLink2Description: JLCPCB Part URL; ComponentLink2URL: https://jlcpcb.com/partdetail/C1864511; ComponentLink3Description: LCSC Part URL; ComponentLink3URL: https://lcsc.com/product-detail/Multilayer-Ceramic-Capacitors-MLCC---SMD-SMT_Taiyo-Yuden-Taiyo-Yuden-HMK105B7331KVHFE_C1864511.html
footprint CAP-0402 (0402 (1005M) Capacitor)
pins: 1, 2

## HMK105B7471KVHFE
designator C?  Capacitance: 470pF  (hidden comment: *)
Capacitor, Ceramic (MLCC), 470pF, ±10%, 100V, X7R, ±10%, SMD 0402; Manufacturer: Taiyo Yuden; Manufacturer Part Number: HMK105B7471KVHFE; Package Size: 0402; JLCPCB Basic Part: No; JLCPCB Part Number: C2766073; Supplier 1: LCSC; Category: Capacitors - MLCC; Supplier Part Number 1: C2766073; Tolerance: ±10%; Voltage Rating: 100V; Temperature Coefficient: X7R; RoHS: Yes; ComponentLink1Description: Datasheet; ComponentLink1URL: https://wmsc.lcsc.com/wmsc/upload/file/pdf/v2/lcsc/2106061634_Taiyo-Yuden-HMK105B7471KVHFE_C2766073.pdf; ComponentLink2Description: JLCPCB Part URL; ComponentLink2URL: https://jlcpcb.com/partdetail/C2766073; ComponentLink3Description: LCSC Part URL; ComponentLink3URL: https://lcsc.com/product-detail/Multilayer-Ceramic-Capacitors-MLCC---SMD-SMT_Taiyo-Yuden-Taiyo-Yuden-HMK105B7471KVHFE_C2766073.html
footprint CAP-0402 (0402 (1005M) Capacitor)
pins: 1, 2

## HMK105B7472KVHFE
designator C?  Capacitance: 4.7nF  (hidden comment: *)
Capacitor, Ceramic (MLCC), 4.7nF, ±10%, 100V, X7R, ±10%, SMD 0402; Manufacturer: Taiyo Yuden; Manufacturer Part Number: HMK105B7472KVHFE; Package Size: 0402; JLCPCB Basic Part: No; JLCPCB Part Number: C1864422; Supplier 1: LCSC; Category: Capacitors - MLCC; Supplier Part Number 1: C1864422; Tolerance: ±10%; Voltage Rating: 100V; Temperature Coefficient: X7R; RoHS: Yes; ComponentLink1Description: Datasheet; ComponentLink1URL: https://wmsc.lcsc.com/wmsc/upload/file/pdf/v2/lcsc/2108160930_Taiyo-Yuden-HMK105B7472KVHFE_C1864422.pdf; ComponentLink2Description: JLCPCB Part URL; ComponentLink2URL: https://jlcpcb.com/partdetail/C1864422; ComponentLink3Description: LCSC Part URL; ComponentLink3URL: https://lcsc.com/product-detail/Multilayer-Ceramic-Capacitors-MLCC---SMD-SMT_Taiyo-Yuden-Taiyo-Yuden-HMK105B7472KVHFE_C1864422.html
footprint CAP-0402 (0402 (1005M) Capacitor)
pins: 1, 2

## JDK105BJ106MV-FD
designator C?  Capacitance: 10uF  (hidden comment: *)
Capacitor, Ceramic (MLCC), 10uF, ±20%, 6.3V, ±20%, SMD 0402; Manufacturer: Taiyo Yuden; Manufacturer Part Number: JDK105BJ106MV-FD; Package Size: 0402; JLCPCB Basic Part: No; JLCPCB Part Number: C841046; Supplier 1: LCSC; Category: Capacitors - MLCC; Supplier Part Number 1: C841046; Tolerance: ±20%; Voltage Rating: 6.3V; RoHS: Yes; ComponentLink1Description: Datasheet; ComponentLink1URL: https://wmsc.lcsc.com/wmsc/upload/file/pdf/v2/lcsc/2304140030_Taiyo-Yuden-JDK105BJ106MV-FD_C841046.pdf; ComponentLink2Description: JLCPCB Part URL; ComponentLink2URL: https://jlcpcb.com/partdetail/C841046; ComponentLink3Description: LCSC Part URL; ComponentLink3URL: https://lcsc.com/product-detail/Multilayer-Ceramic-Capacitors-MLCC---SMD-SMT_Taiyo-Yuden-Taiyo-Yuden-JDK105BJ106MV-FD_C841046.html
footprint CAP-0402 (0402 (1005M) Capacitor)
pins: 1, 2

## JDK105BJ225MV-F
designator C?  Capacitance: 2.2uF  (hidden comment: *)
Capacitor, Ceramic (MLCC), 2.2uF, ±20%, 6.3V, X5R, ±20%, SMD 0402; Manufacturer: Taiyo Yuden; Manufacturer Part Number: JDK105BJ225MV-F; Package Size: 0402; JLCPCB Basic Part: No; JLCPCB Part Number: C385992; Supplier 1: LCSC; Category: Capacitors - MLCC; Supplier Part Number 1: C385992; Tolerance: ±20%; Voltage Rating: 6.3V; Temperature Coefficient: X5R; RoHS: Yes; ComponentLink1Description: Datasheet; ComponentLink1URL: https://wmsc.lcsc.com/wmsc/upload/file/pdf/v2/lcsc/2304140030_Taiyo-Yuden-JDK105BJ225MV-F_C385992.pdf; ComponentLink2Description: JLCPCB Part URL; ComponentLink2URL: https://jlcpcb.com/partdetail/C385992; ComponentLink3Description: LCSC Part URL; ComponentLink3URL: https://lcsc.com/product-detail/Multilayer-Ceramic-Capacitors-MLCC---SMD-SMT_Taiyo-Yuden-Taiyo-Yuden-JDK105BJ225MV-F_C385992.html
footprint CAP-0402 (0402 (1005M) Capacitor)
pins: 1, 2

## JMK105B7224KV-F
designator C?  Capacitance: 220nF  (hidden comment: *)
Capacitor, Ceramic (MLCC), 220nF, ±10%, 6.3V, X7R, ±10%, SMD 0402; Manufacturer: Taiyo Yuden; Manufacturer Part Number: JMK105B7224KV-F; Package Size: 0402; JLCPCB Basic Part: No; JLCPCB Part Number: C412626; Supplier 1: LCSC; Category: Capacitors - MLCC; Supplier Part Number 1: C412626; Tolerance: ±10%; Voltage Rating: 6.3V; Temperature Coefficient: X7R; RoHS: Yes; ComponentLink1Description: Datasheet; ComponentLink1URL: https://wmsc.lcsc.com/wmsc/upload/file/pdf/v2/lcsc/2211282230_Taiyo-Yuden-JMK105B7224KV-F_C412626.pdf; ComponentLink2Description: JLCPCB Part URL; ComponentLink2URL: https://jlcpcb.com/partdetail/C412626; ComponentLink3Description: LCSC Part URL; ComponentLink3URL: https://lcsc.com/product-detail/Multilayer-Ceramic-Capacitors-MLCC---SMD-SMT_Taiyo-Yuden-Taiyo-Yuden-JMK105B7224KV-F_C412626.html
footprint CAP-0402 (0402 (1005M) Capacitor)
pins: 1, 2

## JMK105B7474KVHF
designator C?  Capacitance: 470nF  (hidden comment: *)
Capacitor, Ceramic (MLCC), 470nF, ±10%, 6.3V, X7R, ±10%, SMD 0402; Manufacturer: Taiyo Yuden; Manufacturer Part Number: JMK105B7474KVHF; Package Size: 0402; JLCPCB Basic Part: No; JLCPCB Part Number: C386008; Supplier 1: LCSC; Category: Capacitors - MLCC; Supplier Part Number 1: C386008; Tolerance: ±10%; Voltage Rating: 6.3V; Temperature Coefficient: X7R; RoHS: Yes; ComponentLink1Description: Datasheet; ComponentLink1URL: https://wmsc.lcsc.com/wmsc/upload/file/pdf/v2/lcsc/2304140030_Taiyo-Yuden-JMK105B7474KVHF_C386008.pdf; ComponentLink2Description: JLCPCB Part URL; ComponentLink2URL: https://jlcpcb.com/partdetail/C386008; ComponentLink3Description: LCSC Part URL; ComponentLink3URL: https://lcsc.com/product-detail/Multilayer-Ceramic-Capacitors-MLCC---SMD-SMT_Taiyo-Yuden-Taiyo-Yuden-JMK105B7474KVHF_C386008.html
footprint CAP-0402 (0402 (1005M) Capacitor)
pins: 1, 2

## JMK105BBJ475MV-F
designator C?  Capacitance: 4.7uF  (hidden comment: *)
Capacitor, Ceramic (MLCC), 4.7uF, ±20%, 6.3V, X5R, ±20%, SMD 0402; Manufacturer: Taiyo Yuden; Manufacturer Part Number: JMK105BBJ475MV-F; Package Size: 0402; JLCPCB Basic Part: No; JLCPCB Part Number: C87147; Supplier 1: LCSC; Category: Capacitors - MLCC; Supplier Part Number 1: C87147; Tolerance: ±20%; Voltage Rating: 6.3V; Temperature Coefficient: X5R; RoHS: Yes; ComponentLink1Description: Datasheet; ComponentLink1URL: https://wmsc.lcsc.com/wmsc/upload/file/pdf/v2/lcsc/2211282300_Taiyo-Yuden-JMK105BBJ475MV-F_C87147.pdf; ComponentLink2Description: JLCPCB Part URL; ComponentLink2URL: https://jlcpcb.com/partdetail/C87147; ComponentLink3Description: LCSC Part URL; ComponentLink3URL: https://lcsc.com/product-detail/Multilayer-Ceramic-Capacitors-MLCC---SMD-SMT_Taiyo-Yuden-Taiyo-Yuden-JMK105BBJ475MV-F_C87147.html
footprint CAP-0402 (0402 (1005M) Capacitor)
pins: 1, 2

## JMK105BBJ475MVHF
designator C?  Capacitance: 4.7uF  (hidden comment: *)
Capacitor, Ceramic (MLCC), 4.7uF, ±20%, 6.3V, X5R, ±20%, SMD 0402; Manufacturer: Taiyo Yuden; Manufacturer Part Number: JMK105BBJ475MVHF; Package Size: 0402; JLCPCB Basic Part: No; JLCPCB Part Number: C386009; Supplier 1: LCSC; Category: Capacitors - MLCC; Supplier Part Number 1: C386009; Tolerance: ±20%; Voltage Rating: 6.3V; Temperature Coefficient: X5R; RoHS: Yes; ComponentLink1Description: Datasheet; ComponentLink1URL: https://wmsc.lcsc.com/wmsc/upload/file/pdf/v2/lcsc/2304140030_Taiyo-Yuden-JMK105BBJ475MVHF_C386009.pdf; ComponentLink2Description: JLCPCB Part URL; ComponentLink2URL: https://jlcpcb.com/partdetail/C386009; ComponentLink3Description: LCSC Part URL; ComponentLink3URL: https://lcsc.com/product-detail/Multilayer-Ceramic-Capacitors-MLCC---SMD-SMT_Taiyo-Yuden-Taiyo-Yuden-JMK105BBJ475MVHF_C386009.html
footprint CAP-0402 (0402 (1005M) Capacitor)
pins: 1, 2

## JMK105BBJ475MVMF
designator C?  Capacitance: 4.7uF  (hidden comment: *)
Capacitor, Ceramic (MLCC), 4.7uF, 6.3V, SMD 0402; Manufacturer: Taiyo Yuden; Manufacturer Part Number: JMK105BBJ475MVMF; Package Size: 0402; JLCPCB Basic Part: No; JLCPCB Part Number: C2686246; Supplier 1: LCSC; Category: Capacitors - MLCC; Supplier Part Number 1: C2686246; Voltage Rating: 6.3V; RoHS: Yes; ComponentLink1Description: Datasheet; ComponentLink1URL: https://wmsc.lcsc.com/wmsc/upload/file/pdf/v2/lcsc/2304140030_Taiyo-Yuden-JMK105BBJ475MVMF_C2686246.pdf; ComponentLink2Description: JLCPCB Part URL; ComponentLink2URL: https://jlcpcb.com/partdetail/C2686246; ComponentLink3Description: LCSC Part URL; ComponentLink3URL: https://lcsc.com/product-detail/Multilayer-Ceramic-Capacitors-MLCC---SMD-SMT_Taiyo-Yuden-Taiyo-Yuden-JMK105BBJ475MVMF_C2686246.html
footprint CAP-0402 (0402 (1005M) Capacitor)
pins: 1, 2

## JMK105BC6475MV-F
designator C?  Capacitance: 4.7uF  (hidden comment: *)
Capacitor, Ceramic (MLCC), 4.7uF, ±20%, 6.3V, X6S, ±20%, SMD 0402; Manufacturer: Taiyo Yuden; Manufacturer Part Number: JMK105BC6475MV-F; Package Size: 0402; JLCPCB Basic Part: No; JLCPCB Part Number: C697614; Supplier 1: LCSC; Category: Capacitors - MLCC; Supplier Part Number 1: C697614; Tolerance: ±20%; Voltage Rating: 6.3V; Temperature Coefficient: X6S; RoHS: Yes; ComponentLink1Description: Datasheet; ComponentLink1URL: https://wmsc.lcsc.com/wmsc/upload/file/pdf/v2/lcsc/2008241907_Taiyo-Yuden-JMK105BC6475MV-F_C697614.pdf; ComponentLink2Description: JLCPCB Part URL; ComponentLink2URL: https://jlcpcb.com/partdetail/C697614; ComponentLink3Description: LCSC Part URL; ComponentLink3URL: https://lcsc.com/product-detail/Multilayer-Ceramic-Capacitors-MLCC---SMD-SMT_Taiyo-Yuden-Taiyo-Yuden-JMK105BC6475MV-F_C697614.html
footprint CAP-0402 (0402 (1005M) Capacitor)
pins: 1, 2

## JMK105BJ105KV-F
designator C?  Capacitance: 1uF  (hidden comment: *)
Capacitor, Ceramic (MLCC), 1uF, ±10%, 6.3V, X5R, ±10%, SMD 0402; Manufacturer: Taiyo Yuden; Manufacturer Part Number: JMK105BJ105KV-F; Package Size: 0402; JLCPCB Basic Part: No; JLCPCB Part Number: C87144; Supplier 1: LCSC; Category: Capacitors - MLCC; Supplier Part Number 1: C87144; Tolerance: ±10%; Voltage Rating: 6.3V; Temperature Coefficient: X5R; RoHS: Yes; ComponentLink1Description: Datasheet; ComponentLink1URL: https://wmsc.lcsc.com/wmsc/upload/file/pdf/v2/lcsc/2211282300_Taiyo-Yuden-JMK105BJ105KV-F_C87144.pdf; ComponentLink2Description: JLCPCB Part URL; ComponentLink2URL: https://jlcpcb.com/partdetail/C87144; ComponentLink3Description: LCSC Part URL; ComponentLink3URL: https://lcsc.com/product-detail/Multilayer-Ceramic-Capacitors-MLCC---SMD-SMT_Taiyo-Yuden-Taiyo-Yuden-JMK105BJ105KV-F_C87144.html
footprint CAP-0402 (0402 (1005M) Capacitor)
pins: 1, 2

## JMK105BJ105KVHF
designator C?  Capacitance: 1uF  (hidden comment: *)
Capacitor, Ceramic (MLCC), 1uF, ±10%, 6.3V, X5R, ±10%, SMD 0402; Manufacturer: Taiyo Yuden; Manufacturer Part Number: JMK105BJ105KVHF; Package Size: 0402; JLCPCB Basic Part: No; JLCPCB Part Number: C412451; Supplier 1: LCSC; Category: Capacitors - MLCC; Supplier Part Number 1: C412451; Tolerance: ±10%; Voltage Rating: 6.3V; Temperature Coefficient: X5R; RoHS: Yes; ComponentLink1Description: Datasheet; ComponentLink1URL: https://wmsc.lcsc.com/wmsc/upload/file/pdf/v2/lcsc/2304140030_Taiyo-Yuden-JMK105BJ105KVHF_C412451.pdf; ComponentLink2Description: JLCPCB Part URL; ComponentLink2URL: https://jlcpcb.com/partdetail/C412451; ComponentLink3Description: LCSC Part URL; ComponentLink3URL: https://lcsc.com/product-detail/Multilayer-Ceramic-Capacitors-MLCC---SMD-SMT_Taiyo-Yuden-Taiyo-Yuden-JMK105BJ105KVHF_C412451.html
footprint CAP-0402 (0402 (1005M) Capacitor)
pins: 1, 2

## JMK105BJ224KV-F
designator C?  Capacitance: 220nF  (hidden comment: *)
Capacitor, Ceramic (MLCC), 220nF, ±10%, 6.3V, X5R, ±10%, SMD 0402; Manufacturer: Taiyo Yuden; Manufacturer Part Number: JMK105BJ224KV-F; Package Size: 0402; JLCPCB Basic Part: No; JLCPCB Part Number: C92778; Supplier 1: LCSC; Category: Capacitors - MLCC; Supplier Part Number 1: C92778; Tolerance: ±10%; Voltage Rating: 6.3V; Temperature Coefficient: X5R; RoHS: Yes; ComponentLink1Description: Datasheet; ComponentLink1URL: https://wmsc.lcsc.com/wmsc/upload/file/pdf/v2/lcsc/2211282300_Taiyo-Yuden-JMK105BJ224KV-F_C92778.pdf; ComponentLink2Description: JLCPCB Part URL; ComponentLink2URL: https://jlcpcb.com/partdetail/C92778; ComponentLink3Description: LCSC Part URL; ComponentLink3URL: https://lcsc.com/product-detail/Multilayer-Ceramic-Capacitors-MLCC---SMD-SMT_Taiyo-Yuden-Taiyo-Yuden-JMK105BJ224KV-F_C92778.html
footprint CAP-0402 (0402 (1005M) Capacitor)
pins: 1, 2

## JMK105BJ225KV-F
designator C?  Capacitance: 2.2uF  (hidden comment: *)
Capacitor, Ceramic (MLCC), 2.2uF, ±10%, 6.3V, X5R, ±10%, SMD 0402; Manufacturer: Taiyo Yuden; Manufacturer Part Number: JMK105BJ225KV-F; Package Size: 0402; JLCPCB Basic Part: No; JLCPCB Part Number: C319193; Supplier 1: LCSC; Category: Capacitors - MLCC; Supplier Part Number 1: C319193; Tolerance: ±10%; Voltage Rating: 6.3V; Temperature Coefficient: X5R; RoHS: Yes; ComponentLink1Description: Datasheet; ComponentLink1URL: https://wmsc.lcsc.com/wmsc/upload/file/pdf/v2/lcsc/2211282230_Taiyo-Yuden-JMK105BJ225KV-F_C319193.pdf; ComponentLink2Description: JLCPCB Part URL; ComponentLink2URL: https://jlcpcb.com/partdetail/C319193; ComponentLink3Description: LCSC Part URL; ComponentLink3URL: https://lcsc.com/product-detail/Multilayer-Ceramic-Capacitors-MLCC---SMD-SMT_Taiyo-Yuden-Taiyo-Yuden-JMK105BJ225KV-F_C319193.html
footprint CAP-0402 (0402 (1005M) Capacitor)
pins: 1, 2

## JMK105BJ225MV-F
designator C?  Capacitance: 2.2uF  (hidden comment: *)
Capacitor, Ceramic (MLCC), 2.2uF, ±20%, 6.3V, X5R, ±20%, SMD 0402; Manufacturer: Taiyo Yuden; Manufacturer Part Number: JMK105BJ225MV-F; Package Size: 0402; JLCPCB Basic Part: No; JLCPCB Part Number: C87146; Supplier 1: LCSC; Category: Capacitors - MLCC; Supplier Part Number 1: C87146; Tolerance: ±20%; Voltage Rating: 6.3V; Temperature Coefficient: X5R; RoHS: Yes; ComponentLink1Description: Datasheet; ComponentLink1URL: https://wmsc.lcsc.com/wmsc/upload/file/pdf/v2/lcsc/2211282300_Taiyo-Yuden-JMK105BJ225MV-F_C87146.pdf; ComponentLink2Description: JLCPCB Part URL; ComponentLink2URL: https://jlcpcb.com/partdetail/C87146; ComponentLink3Description: LCSC Part URL; ComponentLink3URL: https://lcsc.com/product-detail/Multilayer-Ceramic-Capacitors-MLCC---SMD-SMT_Taiyo-Yuden-Taiyo-Yuden-JMK105BJ225MV-F_C87146.html
footprint CAP-0402 (0402 (1005M) Capacitor)
pins: 1, 2
